# Altium footprint library Pin Header WR-PHD_2.54mm.PcbLib: 138 footprints (part 9 of 9)
Each footprint in its own frame and in the unit in brackets; x right, y up, seen from the top. Pads: shape width x height; smd on the part's side, far side on the other; paste and mask are expansions set on the pad; w line width, h text height; cw(c..) or ccw(c..) is an arc to the next point about the centre after c.
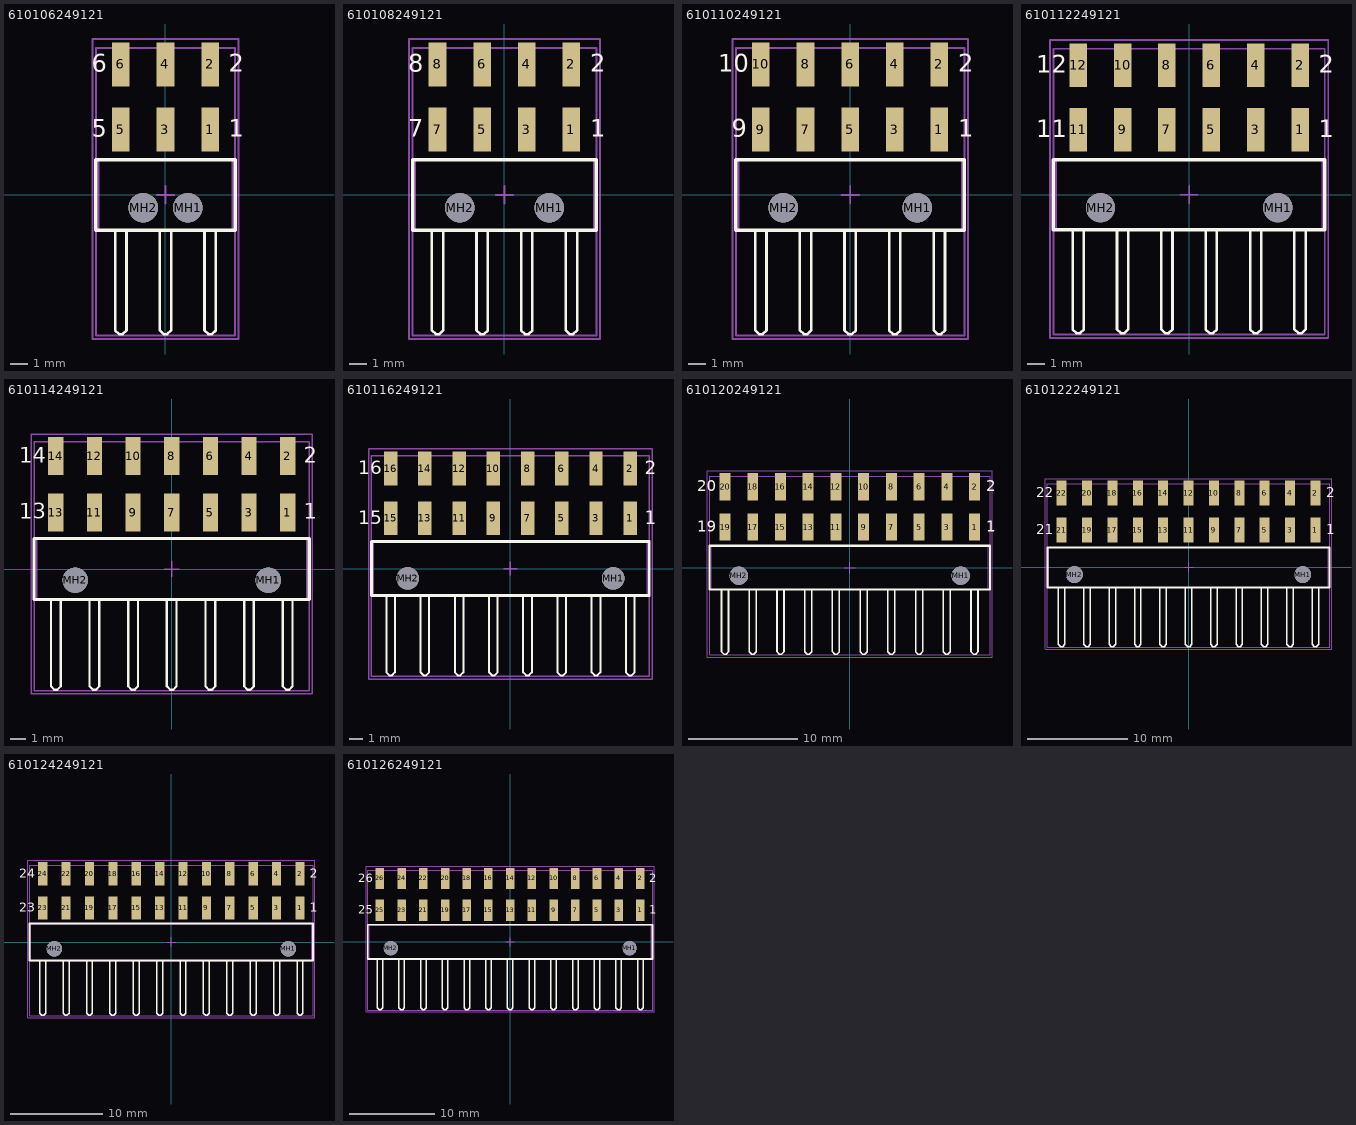
[diagram p8: the footprints below, top view; thin cyan lines are the x and y axes]

## 610106249121 [mm] "Pin Header, pitch 2.54 mm, SMD, Angled, dual row, 6p"
height 5.08
pads (8):
  rect 1x2.5 smd: 1(2.54,3.72) 2(2.54,7.42) 3(0,3.72) 4(0,7.42) 5(-2.54,3.72) 6(-2.54,7.42)
  round 1.68 hole 1.68 unplated: MH1(1.27,-0.73) MH2(-1.27,-0.73)
Top Overlay:
  lines w0.15: -2.86,-2 -2.86,-7.3 -2.86,-7.58 -2.86,-7.705 -2.64,-7.925 -2.44,-7.925 -2.22,-7.705 -2.22,-7.58 -2.22,-7.3 -2.22,-2 ; -0.32,-2 -0.32,-7.3 -0.32,-7.58 -0.32,-7.705 -0.1,-7.925 0.1,-7.925 0.32,-7.705 0.32,-7.58 0.32,-7.3 0.32,-2 ; 2.22,-2 2.22,-7.3 2.22,-7.58 2.22,-7.705 2.44,-7.925 2.64,-7.925 2.86,-7.705 2.86,-7.58 2.86,-7.3 2.86,-2
  lines w0.2: -3.96,-2 -3.96,2 3.96,2 3.96,-2 -3.96,-2
  text "6" at -4.2,7 h1
  text "5" at -4.2,3.3 h1
  text "2" at 3.6,7 h1
  text "1" at 3.6,3.3 h1
Mechanical 11:
  lines w0.1: -3.81,-2 -3.81,2 3.81,2 3.81,-2 -3.81,-2
Mechanical 13:
  lines w0.1: -3.96,-8 -3.96,8.36 3.96,8.36 3.96,-8 -3.96,-8
Mechanical 15:
  lines w0.1: -0.5,0 0.5,0 ; 0,-0.5 0,0.5 ; -4.16,-8.2 4.16,-8.2 4.16,8.87 -4.16,8.87 -4.16,-8.2
3D body "610106249121.stp": height 5.1, standoff -1.38, extent -3.81,-8 3.81,8.16

## 610108249121 [mm] "Pin Header, pitch 2.54 mm, SMD, Angled, dual row, 8p"
height 5.08
pads (10):
  rect 1x2.5 smd: 1(3.81,3.72) 2(3.81,7.42) 3(1.27,3.72) 4(1.27,7.42) 5(-1.27,3.72) 6(-1.27,7.42) 7(-3.81,3.72) 8(-3.81,7.42)
  round 1.68 hole 1.68 unplated: MH1(2.54,-0.73) MH2(-2.54,-0.73)
Top Overlay:
  lines w0.15: -4.13,-2 -4.13,-7.3 -4.13,-7.58 -4.13,-7.705 -3.91,-7.925 -3.71,-7.925 -3.49,-7.705 -3.49,-7.58 -3.49,-7.3 -3.49,-2 ; -1.59,-2 -1.59,-7.3 -1.59,-7.58 -1.59,-7.705 -1.37,-7.925 -1.17,-7.925 -0.95,-7.705 -0.95,-7.58 -0.95,-7.3 -0.95,-2 ; 0.95,-2 0.95,-7.3 0.95,-7.58 0.95,-7.705 1.17,-7.925 1.37,-7.925 1.59,-7.705 1.59,-7.58 1.59,-7.3 1.59,-2 ; 3.49,-2 3.49,-7.3 3.49,-7.58 3.49,-7.705 3.71,-7.925 3.91,-7.925 4.13,-7.705 4.13,-7.58 4.13,-7.3 4.13,-2
  lines w0.2: -5.23,-2 -5.23,2 5.23,2 5.23,-2 -5.23,-2
  text "7" at -5.47,3.3 h1
  text "8" at -5.47,7 h1
  text "2" at 4.87,7 h1
  text "1" at 4.87,3.3 h1
Mechanical 11:
  lines w0.1: -5.08,-2 -5.08,2 5.08,2 5.08,-2 -5.08,-2
Mechanical 13:
  lines w0.1: -5.23,-8 -5.23,8.36 5.23,8.36 5.23,-8 -5.23,-8
Mechanical 15:
  lines w0.1: -0.5,0 0.5,0 ; 0,-0.5 0,0.5 ; -5.43,-8.2 5.43,-8.2 5.43,8.87 -5.43,8.87 -5.43,-8.2
3D body "610108249121.stp": height 5.1, standoff -1.38, extent -5.08,-8 5.08,8.16

## 610110249121 [mm] "Pin Header, pitch 2.54 mm, SMD, Angled, dual row, 10p"
height 5.08
pads (12):
  rect 1x2.5 smd: 1(5.08,3.72) 2(5.08,7.42) 3(2.54,3.72) 4(2.54,7.42) 5(0,3.72) 6(0,7.42) 7(-2.54,3.72) 8(-2.54,7.42) 9(-5.08,3.72) 10(-5.08,7.42)
  round 1.68 hole 1.68 unplated: MH1(3.81,-0.73) MH2(-3.81,-0.73)
Top Overlay:
  lines w0.15: -5.4,-2 -5.4,-7.3 -5.4,-7.58 -5.4,-7.705 -5.18,-7.925 -4.98,-7.925 -4.76,-7.705 -4.76,-7.58 -4.76,-7.3 -4.76,-2 ; -2.86,-2 -2.86,-7.3 -2.86,-7.58 -2.86,-7.705 -2.64,-7.925 -2.44,-7.925 -2.22,-7.705 -2.22,-7.58 -2.22,-7.3 -2.22,-2 ; -0.32,-2 -0.32,-7.3 -0.32,-7.58 -0.32,-7.705 -0.1,-7.925 0.1,-7.925 0.32,-7.705 0.32,-7.58 0.32,-7.3 0.32,-2 ; 2.22,-2 2.22,-7.3 2.22,-7.58 2.22,-7.705 2.44,-7.925 2.64,-7.925 2.86,-7.705 2.86,-7.58 2.86,-7.3 2.86,-2 ; 4.76,-2 4.76,-7.3 4.76,-7.58 4.76,-7.705 4.98,-7.925 5.18,-7.925 5.4,-7.705 5.4,-7.58 5.4,-7.3 5.4,-2
  lines w0.2: -6.5,-2 6.5,-2 6.5,2 -6.5,2 -6.5,-2
  text "1" at 6.14,3.3 h1
  text "2" at 6.14,7 h1
  text "10" at -7.5,7 h1
  text "9" at -6.74,3.3 h1
Mechanical 11:
  lines w0.1: -6.35,-2 6.35,-2 6.35,2 -6.35,2 -6.35,-2
Mechanical 13:
  lines w0.1: -6.5,-8 6.5,-8 6.5,8.36 -6.5,8.36 -6.5,-8
Mechanical 15:
  lines w0.1: -0.5,0 0.5,0 ; 0,-0.5 0,0.5 ; -6.7,-8.2 -6.7,8.87 6.7,8.87 6.7,-8.2 -6.7,-8.2
3D body "610110249121.stp": height 5.1, standoff -1.38, extent -6.35,-8 6.35,8.16

## 610112249121 [mm] "Pin Header, pitch 2.54 mm, SMD, Angled, dual row, 12p"
height 5.08
pads (14):
  rect 1x2.5 smd: 1(6.35,3.72) 2(6.35,7.42) 3(3.81,3.72) 4(3.81,7.42) 5(1.27,3.72) 6(1.27,7.42) 7(-1.27,3.72) 8(-1.27,7.42) 9(-3.81,3.72) 10(-3.81,7.42) 11(-6.35,3.72) 12(-6.35,7.42)
  round 1.68 hole 1.68 unplated: MH1(5.08,-0.73) MH2(-5.08,-0.73)
Top Overlay:
  lines w0.15: -6.67,-2 -6.67,-7.3 -6.67,-7.58 -6.67,-7.705 -6.45,-7.925 -6.25,-7.925 -6.03,-7.705 -6.03,-7.58 -6.03,-7.3 -6.03,-2 ; -4.13,-2 -4.13,-7.3 -4.13,-7.58 -4.13,-7.705 -3.91,-7.925 -3.71,-7.925 -3.49,-7.705 -3.49,-7.58 -3.49,-7.3 -3.49,-2 ; -1.59,-2 -1.59,-7.3 -1.59,-7.58 -1.59,-7.705 -1.37,-7.925 -1.17,-7.925 -0.95,-7.705 -0.95,-7.58 -0.95,-7.3 -0.95,-2 ; 0.95,-2 0.95,-7.3 0.95,-7.58 0.95,-7.705 1.17,-7.925 1.37,-7.925 1.59,-7.705 1.59,-7.58 1.59,-7.3 1.59,-2 ; 3.49,-2 3.49,-7.3 3.49,-7.58 3.49,-7.705 3.71,-7.925 3.91,-7.925 4.13,-7.705 4.13,-7.58 4.13,-7.3 4.13,-2 ; 6.03,-2 6.03,-7.3 6.03,-7.58 6.03,-7.705 6.25,-7.925 6.45,-7.925 6.67,-7.705 6.67,-7.58 6.67,-7.3 6.67,-2
  lines w0.2: -7.77,-2 7.77,-2 7.77,2 -7.77,2 -7.77,-2
  text "1" at 7.41,3.3 h1
  text "2" at 7.41,7 h1
  text "11" at -8.77,3.3 h1
  text "12" at -8.77,7 h1
Mechanical 11:
  lines w0.1: -7.62,-2 7.62,-2 7.62,2 -7.62,2 -7.62,-2
Mechanical 13:
  lines w0.1: -7.77,-8 7.77,-8 7.77,8.36 -7.77,8.36 -7.77,-8
Mechanical 15:
  lines w0.1: -0.5,0 0.5,0 ; 0,-0.5 0,0.5 ; -7.97,-8.2 -7.97,8.87 7.97,8.87 7.97,-8.2 -7.97,-8.2
3D body "610112249121.stp": height 5.1, standoff -1.38, extent -7.62,-8 7.62,8.16

## 610114249121 [mm] "Pin Header, pitch 2.54 mm, SMD, Angled, dual row, 14p"
height 5.08
pads (16):
  rect 1x2.5 smd: 1(7.62,3.72) 2(7.62,7.42) 3(5.08,3.72) 4(5.08,7.42) 5(2.54,3.72) 6(2.54,7.42) 7(0,3.72) 8(0,7.42) 9(-2.54,3.72) 10(-2.54,7.42) 11(-5.08,3.72) 12(-5.08,7.42) 13(-7.62,3.72) 14(-7.62,7.42)
  round 1.68 hole 1.68 unplated: MH1(6.35,-0.73) MH2(-6.35,-0.73)
Top Overlay:
  lines w0.15: -7.94,-2 -7.94,-7.3 -7.94,-7.58 -7.94,-7.705 -7.72,-7.925 -7.52,-7.925 -7.3,-7.705 -7.3,-7.58 -7.3,-7.3 -7.3,-2 ; -5.4,-2 -5.4,-7.3 -5.4,-7.58 -5.4,-7.705 -5.18,-7.925 -4.98,-7.925 -4.76,-7.705 -4.76,-7.58 -4.76,-7.3 -4.76,-2 ; -2.86,-2 -2.86,-7.3 -2.86,-7.58 -2.86,-7.705 -2.64,-7.925 -2.44,-7.925 -2.22,-7.705 -2.22,-7.58 -2.22,-7.3 -2.22,-2 ; -0.32,-2 -0.32,-7.3 -0.32,-7.58 -0.32,-7.705 -0.1,-7.925 0.1,-7.925 0.32,-7.705 0.32,-7.58 0.32,-7.3 0.32,-2 ; 2.22,-2 2.22,-7.3 2.22,-7.58 2.22,-7.705 2.44,-7.925 2.64,-7.925 2.86,-7.705 2.86,-7.58 2.86,-7.3 2.86,-2 ; 4.76,-2 4.76,-7.3 4.76,-7.58 4.76,-7.705 4.98,-7.925 5.18,-7.925 5.4,-7.705 5.4,-7.58 5.4,-7.3 5.4,-2 ; 7.3,-2 7.3,-7.3 7.3,-7.58 7.3,-7.705 7.52,-7.925 7.72,-7.925 7.94,-7.705 7.94,-7.58 7.94,-7.3 7.94,-2
  lines w0.2: -9.04,-2 9.04,-2 9.04,2 -9.04,2 -9.04,-2
  text "1" at 8.68,3.3 h1
  text "2" at 8.68,7 h1
  text "14" at -10.04,7 h1
  text "13" at -10.04,3.3 h1
Mechanical 11:
  lines w0.1: -8.89,-2 8.89,-2 8.89,2 -8.89,2 -8.89,-2
Mechanical 13:
  lines w0.1: -9.04,-8 9.04,-8 9.04,8.36 -9.04,8.36 -9.04,-8
Mechanical 15:
  lines w0.1: -0.5,0 0.5,0 ; 0,-0.5 0,0.5 ; -9.24,-8.2 -9.24,8.87 9.24,8.87 9.24,-8.2 -9.24,-8.2
3D body "610114249121.stp": height 5.1, standoff -1.38, extent -8.89,-8 8.89,8.16

## 610116249121 [mm] "Pin Header, pitch 2.54 mm, SMD, Angled, dual row, 16p"
height 5.08
pads (18):
  rect 1x2.5 smd: 1(8.89,3.72) 2(8.89,7.42) 3(6.35,3.72) 4(6.35,7.42) 5(3.81,3.72) 6(3.81,7.42) 7(1.27,3.72) 8(1.27,7.42) 9(-1.27,3.72) 10(-1.27,7.42) 11(-3.81,3.72) 12(-3.81,7.42) 13(-6.35,3.72) 14(-6.35,7.42) 15(-8.89,3.72) 16(-8.89,7.42)
  round 1.68 hole 1.68 unplated: MH1(7.62,-0.73) MH2(-7.62,-0.73)
Top Overlay:
  lines w0.15: -9.21,-2 -9.21,-7.3 -9.21,-7.58 -9.21,-7.705 -8.99,-7.925 -8.79,-7.925 -8.57,-7.705 -8.57,-7.58 -8.57,-7.3 -8.57,-2 ; -6.67,-2 -6.67,-7.3 -6.67,-7.58 -6.67,-7.705 -6.45,-7.925 -6.25,-7.925 -6.03,-7.705 -6.03,-7.58 -6.03,-7.3 -6.03,-2 ; -4.13,-2 -4.13,-7.3 -4.13,-7.58 -4.13,-7.705 -3.91,-7.925 -3.71,-7.925 -3.49,-7.705 -3.49,-7.58 -3.49,-7.3 -3.49,-2 ; -1.59,-2 -1.59,-7.3 -1.59,-7.58 -1.59,-7.705 -1.37,-7.925 -1.17,-7.925 -0.95,-7.705 -0.95,-7.58 -0.95,-7.3 -0.95,-2 ; 0.95,-2 0.95,-7.3 0.95,-7.58 0.95,-7.705 1.17,-7.925 1.37,-7.925 1.59,-7.705 1.59,-7.58 1.59,-7.3 1.59,-2 ; 3.49,-2 3.49,-7.3 3.49,-7.58 3.49,-7.705 3.71,-7.925 3.91,-7.925 4.13,-7.705 4.13,-7.58 4.13,-7.3 4.13,-2 ; 6.03,-2 6.03,-7.3 6.03,-7.58 6.03,-7.705 6.25,-7.925 6.45,-7.925 6.67,-7.705 6.67,-7.58 6.67,-7.3 6.67,-2 ; 8.57,-2 8.57,-7.3 8.57,-7.58 8.57,-7.705 8.79,-7.925 8.99,-7.925 9.21,-7.705 9.21,-7.58 9.21,-7.3 9.21,-2
  lines w0.2: -10.31,-2 10.31,-2 10.31,2 -10.31,2 -10.31,-2
  text "15" at -11.31,3.3 h1
  text "16" at -11.31,7 h1
  text "1" at 9.95,3.3 h1
  text "2" at 9.95,7 h1
Mechanical 11:
  lines w0.1: -10.16,-2 10.16,-2 10.16,2 -10.16,2 -10.16,-2
Mechanical 13:
  lines w0.1: -10.31,-8 10.31,-8 10.31,8.36 -10.31,8.36 -10.31,-8
Mechanical 15:
  lines w0.1: -0.5,0 0.5,0 ; 0,-0.5 0,0.5 ; -10.51,-8.2 -10.51,8.87 10.51,8.87 10.51,-8.2 -10.51,-8.2
3D body "610116249121.stp": height 5.1, standoff -1.38, extent -10.16,-8 10.16,8.16

## 610120249121 [mm] "Pin Header, pitch 2.54 mm, SMD, Angled, dual row, 20p"
height 5.08
pads (22):
  rect 1x2.5 smd: 1(11.43,3.72) 2(11.43,7.42) 3(8.89,3.72) 4(8.89,7.42) 5(6.35,3.72) 6(6.35,7.42) 7(3.81,3.72) 8(3.81,7.42) 9(1.27,3.72) 10(1.27,7.42) 11(-1.27,3.72) 12(-1.27,7.42) 13(-3.81,3.72) 14(-3.81,7.42) 15(-6.35,3.72) 16(-6.35,7.42) 17(-8.89,3.72) 18(-8.89,7.42) 19(-11.43,3.72) 20(-11.43,7.42)
  round 1.68 hole 1.68 unplated: MH1(10.16,-0.73) MH2(-10.16,-0.73)
Top Overlay:
  lines w0.15: -11.75,-2 -11.75,-7.3 -11.75,-7.58 -11.75,-7.705 -11.53,-7.925 -11.33,-7.925 -11.11,-7.705 -11.11,-7.58 -11.11,-7.3 -11.11,-2 ; -9.21,-2 -9.21,-7.3 -9.21,-7.58 -9.21,-7.705 -8.99,-7.925 -8.79,-7.925 -8.57,-7.705 -8.57,-7.58 -8.57,-7.3 -8.57,-2 ; -6.67,-2 -6.67,-7.3 -6.67,-7.58 -6.67,-7.705 -6.45,-7.925 -6.25,-7.925 -6.03,-7.705 -6.03,-7.58 -6.03,-7.3 -6.03,-2 ; -4.13,-2 -4.13,-7.3 -4.13,-7.58 -4.13,-7.705 -3.91,-7.925 -3.71,-7.925 -3.49,-7.705 -3.49,-7.58 -3.49,-7.3 -3.49,-2 ; -1.59,-2 -1.59,-7.3 -1.59,-7.58 -1.59,-7.705 -1.37,-7.925 -1.17,-7.925 -0.95,-7.705 -0.95,-7.58 -0.95,-7.3 -0.95,-2 ; 0.95,-2 0.95,-7.3 0.95,-7.58 0.95,-7.705 1.17,-7.925 1.37,-7.925 1.59,-7.705 1.59,-7.58 1.59,-7.3 1.59,-2 ; 3.49,-2 3.49,-7.3 3.49,-7.58 3.49,-7.705 3.71,-7.925 3.91,-7.925 4.13,-7.705 4.13,-7.58 4.13,-7.3 4.13,-2 ; 6.03,-2 6.03,-7.3 6.03,-7.58 6.03,-7.705 6.25,-7.925 6.45,-7.925 6.67,-7.705 6.67,-7.58 6.67,-7.3 6.67,-2 ; 8.57,-2 8.57,-7.3 8.57,-7.58 8.57,-7.705 8.79,-7.925 8.99,-7.925 9.21,-7.705 9.21,-7.58 9.21,-7.3 9.21,-2 ; 11.11,-2 11.11,-7.3 11.11,-7.58 11.11,-7.705 11.33,-7.925 11.53,-7.925 11.75,-7.705 11.75,-7.58 11.75,-7.3 11.75,-2
  lines w0.2: -12.85,-2 -12.85,2 12.85,2 12.85,-2 -12.85,-2
  text "2" at 12.49,7 h1
  text "1" at 12.49,3.3 h1
  text "20" at -14,7 h1
  text "19" at -14,3.3 h1
Mechanical 11:
  lines w0.1: -12.7,-2 -12.7,2 12.7,2 12.7,-2 -12.7,-2
Mechanical 13:
  lines w0.1: -12.85,-8 -12.85,8.36 12.85,8.36 12.85,-8 -12.85,-8
Mechanical 15:
  lines w0.1: -0.5,0 0.5,0 ; 0,-0.5 0,0.5 ; -13.05,-8.2 13.05,-8.2 13.05,8.87 -13.05,8.87 -13.05,-8.2
3D body "610120249121.stp": height 5.1, standoff -1.38, extent -12.7,-8 12.7,8.16

## 610122249121 [mm] "Pin Header, pitch 2.54 mm, SMD, Angled, dual row, 22p"
height 5.08
pads (24):
  rect 1x2.5 smd: 1(12.7,3.72) 2(12.7,7.42) 3(10.16,3.72) 4(10.16,7.42) 5(7.62,3.72) 6(7.62,7.42) 7(5.08,3.72) 8(5.08,7.42) 9(2.54,3.72) 10(2.54,7.42) 11(0,3.72) 12(0,7.42) 13(-2.54,3.72) 14(-2.54,7.42) 15(-5.08,3.72) 16(-5.08,7.42) 17(-7.62,3.72) 18(-7.62,7.42) 19(-10.16,3.72) 20(-10.16,7.42) 21(-12.7,3.72) 22(-12.7,7.42)
  round 1.68 hole 1.68 unplated: MH1(11.43,-0.73) MH2(-11.43,-0.73)
Top Overlay:
  lines w0.15: -13.02,-2 -13.02,-7.3 -13.02,-7.58 -13.02,-7.705 -12.8,-7.925 -12.6,-7.925 -12.38,-7.705 -12.38,-7.58 -12.38,-7.3 -12.38,-2 ; -10.48,-2 -10.48,-7.3 -10.48,-7.58 -10.48,-7.705 -10.26,-7.925 -10.06,-7.925 -9.84,-7.705 -9.84,-7.58 -9.84,-7.3 -9.84,-2 ; -7.94,-2 -7.94,-7.3 -7.94,-7.58 -7.94,-7.705 -7.72,-7.925 -7.52,-7.925 -7.3,-7.705 -7.3,-7.58 -7.3,-7.3 -7.3,-2 ; -5.4,-2 -5.4,-7.3 -5.4,-7.58 -5.4,-7.705 -5.18,-7.925 -4.98,-7.925 -4.76,-7.705 -4.76,-7.58 -4.76,-7.3 -4.76,-2 ; -2.86,-2 -2.86,-7.3 -2.86,-7.58 -2.86,-7.705 -2.64,-7.925 -2.44,-7.925 -2.22,-7.705 -2.22,-7.58 -2.22,-7.3 -2.22,-2 ; -0.32,-2 -0.32,-7.3 -0.32,-7.58 -0.32,-7.705 -0.1,-7.925 0.1,-7.925 0.32,-7.705 0.32,-7.58 0.32,-7.3 0.32,-2 ; 2.22,-2 2.22,-7.3 2.22,-7.58 2.22,-7.705 2.44,-7.925 2.64,-7.925 2.86,-7.705 2.86,-7.58 2.86,-7.3 2.86,-2 ; 4.76,-2 4.76,-7.3 4.76,-7.58 4.76,-7.705 4.98,-7.925 5.18,-7.925 5.4,-7.705 5.4,-7.58 5.4,-7.3 5.4,-2 ; 7.3,-2 7.3,-7.3 7.3,-7.58 7.3,-7.705 7.52,-7.925 7.72,-7.925 7.94,-7.705 7.94,-7.58 7.94,-7.3 7.94,-2 ; 9.84,-2 9.84,-7.3 9.84,-7.58 9.84,-7.705 10.06,-7.925 10.26,-7.925 10.48,-7.705 10.48,-7.58 10.48,-7.3 10.48,-2 ; 12.38,-2 12.38,-7.3 12.38,-7.58 12.38,-7.705 12.6,-7.925 12.8,-7.925 13.02,-7.705 13.02,-7.58 13.02,-7.3 13.02,-2
  lines w0.2: -14.12,-2 -14.12,2 14.12,2 14.12,-2 -14.12,-2
  text "2" at 13.76,7 h1
  text "1" at 13.76,3.3 h1
  text "21" at -15.27,3.3 h1
  text "22" at -15.27,7 h1
Mechanical 11:
  lines w0.1: -13.97,-2 -13.97,2 13.97,2 13.97,-2 -13.97,-2
Mechanical 13:
  lines w0.1: -14.12,-8 -14.12,8.36 14.12,8.36 14.12,-8 -14.12,-8
Mechanical 15:
  lines w0.1: -0.5,0 0.5,0 ; 0,-0.5 0,0.5 ; -14.32,-8.2 14.32,-8.2 14.32,8.87 -14.32,8.87 -14.32,-8.2
3D body "610122249121.stp": height 5.1, standoff -1.38, extent -13.97,-8 13.97,8.16

## 610124249121 [mm] "Pin Header, pitch 2.54 mm, SMD, Angled, dual row, 24p"
height 5.08
pads (26):
  rect 1x2.5 smd: 1(13.97,3.72) 2(13.97,7.42) 3(11.43,3.72) 4(11.43,7.42) 5(8.89,3.72) 6(8.89,7.42) 7(6.35,3.72) 8(6.35,7.42) 9(3.81,3.72) 10(3.81,7.42) 11(1.27,3.72) 12(1.27,7.42) 13(-1.27,3.72) 14(-1.27,7.42) 15(-3.81,3.72) 16(-3.81,7.42) 17(-6.35,3.72) 18(-6.35,7.42) 19(-8.89,3.72) 20(-8.89,7.42) 21(-11.43,3.72) 22(-11.43,7.42) 23(-13.97,3.72) 24(-13.97,7.42)
  round 1.68 hole 1.68 unplated: MH1(12.7,-0.73) MH2(-12.7,-0.73)
Top Overlay:
  lines w0.15: -14.29,-2 -14.29,-7.3 -14.29,-7.58 -14.29,-7.705 -14.07,-7.925 -13.87,-7.925 -13.65,-7.705 -13.65,-7.58 -13.65,-7.3 -13.65,-2 ; -11.75,-2 -11.75,-7.3 -11.75,-7.58 -11.75,-7.705 -11.53,-7.925 -11.33,-7.925 -11.11,-7.705 -11.11,-7.58 -11.11,-7.3 -11.11,-2 ; -9.21,-2 -9.21,-7.3 -9.21,-7.58 -9.21,-7.705 -8.99,-7.925 -8.79,-7.925 -8.57,-7.705 -8.57,-7.58 -8.57,-7.3 -8.57,-2 ; -6.67,-2 -6.67,-7.3 -6.67,-7.58 -6.67,-7.705 -6.45,-7.925 -6.25,-7.925 -6.03,-7.705 -6.03,-7.58 -6.03,-7.3 -6.03,-2 ; -4.13,-2 -4.13,-7.3 -4.13,-7.58 -4.13,-7.705 -3.91,-7.925 -3.71,-7.925 -3.49,-7.705 -3.49,-7.58 -3.49,-7.3 -3.49,-2 ; -1.59,-2 -1.59,-7.3 -1.59,-7.58 -1.59,-7.705 -1.37,-7.925 -1.17,-7.925 -0.95,-7.705 -0.95,-7.58 -0.95,-7.3 -0.95,-2 ; 0.95,-2 0.95,-7.3 0.95,-7.58 0.95,-7.705 1.17,-7.925 1.37,-7.925 1.59,-7.705 1.59,-7.58 1.59,-7.3 1.59,-2 ; 3.49,-2 3.49,-7.3 3.49,-7.58 3.49,-7.705 3.71,-7.925 3.91,-7.925 4.13,-7.705 4.13,-7.58 4.13,-7.3 4.13,-2 ; 6.03,-2 6.03,-7.3 6.03,-7.58 6.03,-7.705 6.25,-7.925 6.45,-7.925 6.67,-7.705 6.67,-7.58 6.67,-7.3 6.67,-2 ; 8.57,-2 8.57,-7.3 8.57,-7.58 8.57,-7.705 8.79,-7.925 8.99,-7.925 9.21,-7.705 9.21,-7.58 9.21,-7.3 9.21,-2 ; 11.11,-2 11.11,-7.3 11.11,-7.58 11.11,-7.705 11.33,-7.925 11.53,-7.925 11.75,-7.705 11.75,-7.58 11.75,-7.3 11.75,-2 ; 13.65,-2 13.65,-7.3 13.65,-7.58 13.65,-7.705 13.87,-7.925 14.07,-7.925 14.29,-7.705 14.29,-7.58 14.29,-7.3 14.29,-2
  lines w0.2: -15.39,-2 -15.39,2 15.39,2 15.39,-2 -15.39,-2
  text "2" at 15.03,7 h1
  text "1" at 15.03,3.3 h1
  text "23" at -16.54,3.3 h1
  text "24" at -16.54,7 h1
Mechanical 11:
  lines w0.1: -15.24,-2 -15.24,2 15.24,2 15.24,-2 -15.24,-2
Mechanical 13:
  lines w0.1: -15.39,-8 -15.39,8.36 15.39,8.36 15.39,-8 -15.39,-8
Mechanical 15:
  lines w0.1: -0.5,0 0.5,0 ; 0,-0.5 0,0.5 ; -15.59,-8.2 15.59,-8.2 15.59,8.87 -15.59,8.87 -15.59,-8.2
3D body "610124249121.stp": height 5.1, standoff -1.38, extent -15.24,-8 15.24,8.16

## 610126249121 [mm] "Pin Header, pitch 2.54 mm, SMD, Angled, dual row, 26p"
height 5.08
pads (28):
  rect 1x2.5 smd: 1(15.24,3.72) 2(15.24,7.42) 3(12.7,3.72) 4(12.7,7.42) 5(10.16,3.72) 6(10.16,7.42) 7(7.62,3.72) 8(7.62,7.42) 9(5.08,3.72) 10(5.08,7.42) 11(2.54,3.72) 12(2.54,7.42) 13(0,3.72) 14(0,7.42) 15(-2.54,3.72) 16(-2.54,7.42) 17(-5.08,3.72) 18(-5.08,7.42) 19(-7.62,3.72) 20(-7.62,7.42) 21(-10.16,3.72) 22(-10.16,7.42) 23(-12.7,3.72) 24(-12.7,7.42) 25(-15.24,3.72) 26(-15.24,7.42)
  round 1.68 hole 1.68 unplated: MH1(13.97,-0.73) MH2(-13.97,-0.73)
Top Overlay:
  lines w0.15: -15.56,-2 -15.56,-7.3 -15.56,-7.58 -15.56,-7.705 -15.34,-7.925 -15.14,-7.925 -14.92,-7.705 -14.92,-7.58 -14.92,-7.3 -14.92,-2 ; -13.02,-2 -13.02,-7.3 -13.02,-7.58 -13.02,-7.705 -12.8,-7.925 -12.6,-7.925 -12.38,-7.705 -12.38,-7.58 -12.38,-7.3 -12.38,-2 ; -10.48,-2 -10.48,-7.3 -10.48,-7.58 -10.48,-7.705 -10.26,-7.925 -10.06,-7.925 -9.84,-7.705 -9.84,-7.58 -9.84,-7.3 -9.84,-2 ; -7.94,-2 -7.94,-7.3 -7.94,-7.58 -7.94,-7.705 -7.72,-7.925 -7.52,-7.925 -7.3,-7.705 -7.3,-7.58 -7.3,-7.3 -7.3,-2 ; -5.4,-2 -5.4,-7.3 -5.4,-7.58 -5.4,-7.705 -5.18,-7.925 -4.98,-7.925 -4.76,-7.705 -4.76,-7.58 -4.76,-7.3 -4.76,-2 ; -2.86,-2 -2.86,-7.3 -2.86,-7.58 -2.86,-7.705 -2.64,-7.925 -2.44,-7.925 -2.22,-7.705 -2.22,-7.58 -2.22,-7.3 -2.22,-2 ; -0.32,-2 -0.32,-7.3 -0.32,-7.58 -0.32,-7.705 -0.1,-7.925 0.1,-7.925 0.32,-7.705 0.32,-7.58 0.32,-7.3 0.32,-2 ; 2.22,-2 2.22,-7.3 2.22,-7.58 2.22,-7.705 2.44,-7.925 2.64,-7.925 2.86,-7.705 2.86,-7.58 2.86,-7.3 2.86,-2 ; 4.76,-2 4.76,-7.3 4.76,-7.58 4.76,-7.705 4.98,-7.925 5.18,-7.925 5.4,-7.705 5.4,-7.58 5.4,-7.3 5.4,-2 ; 7.3,-2 7.3,-7.3 7.3,-7.58 7.3,-7.705 7.52,-7.925 7.72,-7.925 7.94,-7.705 7.94,-7.58 7.94,-7.3 7.94,-2 ; 9.84,-2 9.84,-7.3 9.84,-7.58 9.84,-7.705 10.06,-7.925 10.26,-7.925 10.48,-7.705 10.48,-7.58 10.48,-7.3 10.48,-2 ; 12.38,-2 12.38,-7.3 12.38,-7.58 12.38,-7.705 12.6,-7.925 12.8,-7.925 13.02,-7.705 13.02,-7.58 13.02,-7.3 13.02,-2 ; 14.92,-2 14.92,-7.3 14.92,-7.58 14.92,-7.705 15.14,-7.925 15.34,-7.925 15.56,-7.705 15.56,-7.58 15.56,-7.3 15.56,-2
  lines w0.2: -16.66,-2 -16.66,2 16.66,2 16.66,-2 -16.66,-2
  text "2" at 16.3,7 h1
  text "1" at 16.3,3.3 h1
  text "26" at -17.81,7 h1
  text "25" at -17.81,3.3 h1
Mechanical 11:
  lines w0.1: -16.51,-2 -16.51,2 16.51,2 16.51,-2 -16.51,-2
Mechanical 13:
  lines w0.1: -16.66,-8 -16.66,8.36 16.66,8.36 16.66,-8 -16.66,-8
Mechanical 15:
  lines w0.1: -0.5,0 0.5,0 ; 0,-0.5 0,0.5 ; -16.86,-8.2 16.86,-8.2 16.86,8.87 -16.86,8.87 -16.86,-8.2
3D body "610126249121.stp": height 5.1, standoff -1.38, extent -16.51,-8 16.51,8.16